# Altium footprint library 2020-09-26_17-27-19.PcbLib: 69 footprints (part 5 of 5)
Each footprint in its own frame and in the unit in brackets; x right, y up, seen from the top. Pads: shape width x height; smd on the part's side, far side on the other; paste and mask are expansions set on the pad; w line width, h text height; cw(c..) or ccw(c..) is an arc to the next point about the centre after c.
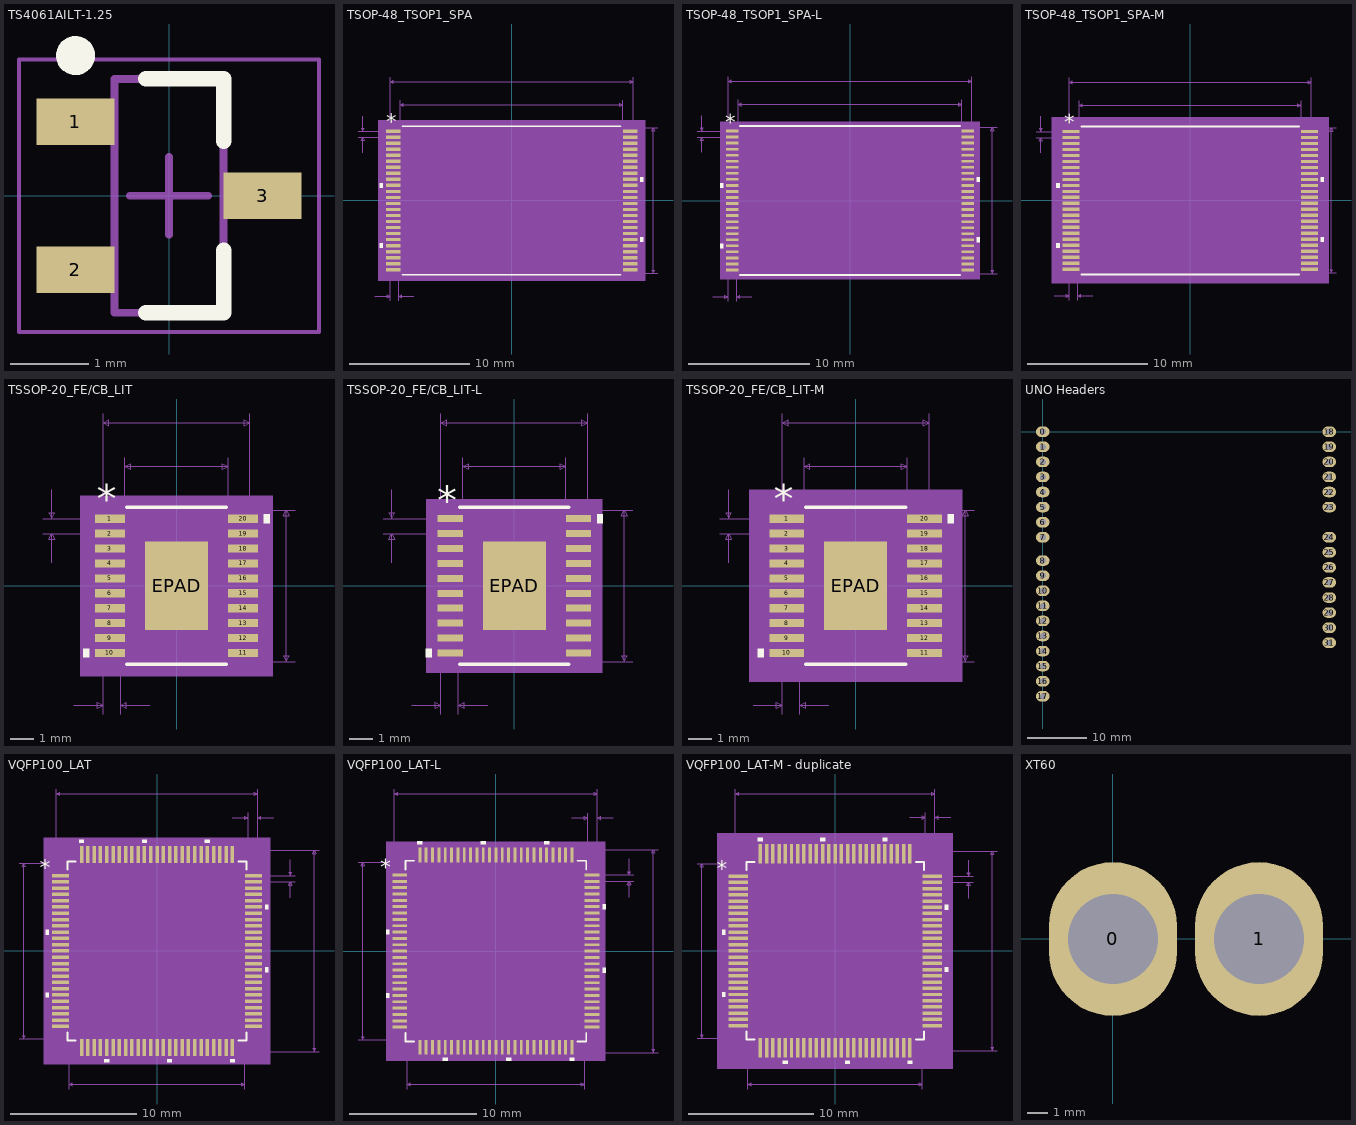
[diagram p4: the footprints below, top view; thin cyan lines are the x and y axes]

## TS4061AILT-1.25 [mm] "SOT23, 3-Leads, Body 2.90x2.45mm, Pitch 0.95mm, IPC Medium Density"
height 1.12
pads (3):
  rect 1x0.6 smd: 1(-1.2,0.95) 2(-1.2,-0.95) 3(1.2,0)
Top Overlay:
  circle w0.25: c-1.2,1.8 r0.125
  lines w0.2: -0.3,-1.5 0.7,-1.5 0.7,-0.7 ; -0.3,1.5 0.7,1.5 0.7,0.7
Mechanical 13:
  lines w0.1: -0.7,-1.5 0.7,-1.5 0.7,1.5 -0.7,1.5 -0.7,-1.5
Mechanical 15:
  lines w0.05: -1.925,-1.75 1.925,-1.75 1.925,1.75 -1.925,1.75 -1.925,-1.75
  lines w0.1: -0.5,0 0.5,0 ; 0,-0.5 0,0.5
3D body "SOT95P245X112-3N.step": height 1.12, standoff 0, extent -1.3,-1.5 1.3,1.5

## TSOP-48_TSOP1_SPA [mil]
pads (48):
  rect 47.5x11 smd paste+0 mask+0: 1(-387.75,226.38) 2(-387.75,206.69) 3(-387.75,187.01) 4(-387.75,167.32) 5(-387.75,147.64) 6(-387.75,127.95) 7(-387.75,108.27) 8(-387.75,88.58) 9(-387.75,68.9) 10(-387.75,49.21) 11(-387.75,29.53) 12(-387.75,9.84) 13(-387.75,-9.84) 14(-387.75,-29.53) 15(-387.75,-49.21) 16(-387.75,-68.9) 17(-387.75,-88.58) 18(-387.75,-108.27) 19(-387.75,-127.95) 20(-387.75,-147.64) 21(-387.75,-167.32) 22(-387.75,-187.01) 23(-387.75,-206.69) 24(-387.75,-226.38) 25(387.75,-226.38) 26(387.75,-206.69) 27(387.75,-187.01) 28(387.75,-167.32) 29(387.75,-147.64) 30(387.75,-127.95) 31(387.75,-108.27) 32(387.75,-88.58) 33(387.75,-68.9) 34(387.75,-49.21) 35(387.75,-29.53) 36(387.75,-9.84) 37(387.75,9.84) 38(387.75,29.53) 39(387.75,49.21) 40(387.75,68.9) 41(387.75,88.58) 42(387.75,108.27) 43(387.75,127.95) 44(387.75,147.64) 45(387.75,167.32) 46(387.75,187.01) 47(387.75,206.69) 48(387.75,226.38)
Top Overlay:
  region: -421.5,56.71 -431.5,56.71 -431.5,41.71 -421.5,41.71
  region: -421.5,-140.14 -431.5,-140.14 -431.5,-155.14 -421.5,-155.14
  region: 421.5,-120.45 431.5,-120.45 431.5,-135.45 421.5,-135.45
  region: 421.5,76.4 431.5,76.4 431.5,61.4 421.5,61.4
  lines w6: -357.08,-243 357.08,-243 ; -357.08,243 357.08,243
  text "*" at -410.25,232.38 h50
Mechanical 5:
  region: 436.5,-263 -436.5,-263 -436.5,263 436.5,263
Mechanical 7:
  lines w1: -502.75,206.69 -387.75,206.69 ; -502.75,226.38 -387.75,226.38 ; -487.75,156.69 -487.75,206.69 ; -487.75,276.38 -487.75,226.38 ; -447.5,-313 -397.5,-313 ; -397.5,-328 -397.5,0 -397.5,403 ; -369.5,-328 -369.5,0 ; -364,0 -364,328 ; -319.5,-313 -369.5,-313 ; 0,-238 479,-238 ; 0,238 479,238 ; 364,0 364,328 ; 397.5,0 397.5,403 ; -487.75,206.69 -492.75,196.69 -482.75,196.69 -487.75,206.69 ; -487.75,226.38 -492.75,236.38 -482.75,236.38 -487.75,226.38 ; -397.5,-313 -407.5,-308 -407.5,-318 -397.5,-313 ; -397.5,388 397.5,388 ; -397.5,388 -387.5,393 -387.5,383 -397.5,388 ; -369.5,-313 -359.5,-308 -359.5,-318 -369.5,-313 ; -364,313 364,313 ; -364,313 -354,318 -354,308 -364,313 ; 364,313 354,318 354,308 364,313 ; 397.5,388 387.5,393 387.5,383 397.5,388 ; 464,-238 464,238 ; 464,-238 459,-228 469,-228 464,-238 ; 464,238 459,228 469,228 464,238
  text "Default Padstyle: RX47p5Y11D0T" at -375,-438 h50
  text "Pin One Padstyle: RX47p5Y11D0T" at -375,-498 h50
  text "Alt 1 Padstyle: OX60Y90D30P" at -337.5,-678 h50
  text "Alt 2 Padstyle: OX90Y60D30P" at -337.5,-738 h50
  text "0.728in/18.491mm" at -100,333 h25
  text "0.795in/20.193mm" at -100,408 h25
  text "0.476in/12.09mm" at 484,-12.5 h25
  text "0.02in/0.5mm" at -657.75,204.04 h25
  text "0.028in/0.711mm" at -477.25,-358 h25
Mechanical 13:
  drawing of 197 lines, arcs and shapes, not listed
  text "*" at -361.5,185 h50
Mechanical 15:
  region: -374,-241.88 -421.5,-241.88 -421.5,241.88 -374,241.88 -374,248 374,248 374,241.88 421.5,241.88 421.5,-241.88 374,-241.88 374,-248 -374,-248
  lines w6: -421.5,-241.88 -421.5,241.88 -374,241.88 -374,248 374,248 374,241.88 421.5,241.88 421.5,-241.88 374,-241.88 374,-248 -374,-248 -374,-241.88 -421.5,-241.88
3D body: height 10, standoff 0, extent 0,0 10,10

## TSOP-48_TSOP1_SPA-L [mil]
pads (48):
  rect 39.5x9 smd paste+0 mask+0: 1(-383.75,226.38) 2(-383.75,206.69) 3(-383.75,187.01) 4(-383.75,167.32) 5(-383.75,147.64) 6(-383.75,127.95) 7(-383.75,108.27) 8(-383.75,88.58) 9(-383.75,68.9) 10(-383.75,49.21) 11(-383.75,29.53) 12(-383.75,9.84) 13(-383.75,-9.84) 14(-383.75,-29.53) 15(-383.75,-49.21) 16(-383.75,-68.9) 17(-383.75,-88.58) 18(-383.75,-108.27) 19(-383.75,-127.95) 20(-383.75,-147.64) 21(-383.75,-167.32) 22(-383.75,-187.01) 23(-383.75,-206.69) 24(-383.75,-226.38) 25(383.75,-226.38) 26(383.75,-206.69) 27(383.75,-187.01) 28(383.75,-167.32) 29(383.75,-147.64) 30(383.75,-127.95) 31(383.75,-108.27) 32(383.75,-88.58) 33(383.75,-68.9) 34(383.75,-49.21) 35(383.75,-29.53) 36(383.75,-9.84) 37(383.75,9.84) 38(383.75,29.53) 39(383.75,49.21) 40(383.75,68.9) 41(383.75,88.58) 42(383.75,108.27) 43(383.75,127.95) 44(383.75,147.64) 45(383.75,167.32) 46(383.75,187.01) 47(383.75,206.69) 48(383.75,226.38)
Top Overlay:
  region: 413.5,76.4 423.5,76.4 423.5,61.4 413.5,61.4
  region: 413.5,-120.45 423.5,-120.45 423.5,-135.45 413.5,-135.45
  region: -413.5,-140.14 -423.5,-140.14 -423.5,-155.14 -413.5,-155.14
  region: -413.5,56.71 -423.5,56.71 -423.5,41.71 -413.5,41.71
  lines w6: -359.03,-243 359.03,-243 ; -359.03,243 359.03,243
  text "*" at -406.25,230.38 h50
Mechanical 5:
  region: 422.5,-257 -422.5,-257 -422.5,257 422.5,257
Mechanical 7:
  lines w1: -498.75,206.69 -383.75,206.69 ; -498.75,226.38 -383.75,226.38 ; -483.75,156.69 -483.75,206.69 ; -483.75,276.38 -483.75,226.38 ; -447.5,-313 -397.5,-313 ; -397.5,-328 -397.5,0 -397.5,403 ; -369.5,-328 -369.5,0 ; -364,0 -364,328 ; -319.5,-313 -369.5,-313 ; 0,-238 479,-238 ; 0,238 479,238 ; 364,0 364,328 ; 397.5,0 397.5,403 ; -483.75,206.69 -478.75,196.69 -488.75,196.69 -483.75,206.69 ; -483.75,226.38 -478.75,236.38 -488.75,236.38 -483.75,226.38 ; -397.5,-313 -407.5,-318 -407.5,-308 -397.5,-313 ; -397.5,388 -387.5,383 -387.5,393 -397.5,388 ; -397.5,388 397.5,388 ; -369.5,-313 -359.5,-318 -359.5,-308 -369.5,-313 ; -364,313 -354,308 -354,318 -364,313 ; -364,313 364,313 ; 364,313 354,308 354,318 364,313 ; 397.5,388 387.5,383 387.5,393 397.5,388 ; 464,-238 469,-228 459,-228 464,-238 ; 464,-238 464,238 ; 464,238 469,228 459,228 464,238
  text "0.028in/0.711mm" at -477.25,-358 h25
  text "0.02in/0.5mm" at -653.75,204.04 h25
  text "0.476in/12.09mm" at 484,-12.5 h25
  text "0.795in/20.193mm" at -100,408 h25
  text "0.728in/18.491mm" at -100,333 h25
  text "Alt 2 Padstyle: OX90Y60D30P" at -337.5,-738 h50
  text "Alt 1 Padstyle: OX60Y90D30P" at -337.5,-678 h50
  text "Pin One Padstyle: RX39p5Y9D0T" at -362.5,-498 h50
  text "Default Padstyle: RX39p5Y9D0T" at -362.5,-438 h50
Mechanical 13:
  drawing of 197 lines, arcs and shapes, not listed
  text "*" at -361.5,185 h50
Mechanical 15:
  region: -368,-234.88 -407.5,-234.88 -407.5,234.88 -368,234.88 -368,242 368,242 368,234.88 407.5,234.88 407.5,-234.88 368,-234.88 368,-242 -368,-242
  lines w6: -407.5,-234.88 -368,-234.88 -368,-242 368,-242 368,-234.88 407.5,-234.88 407.5,234.88 368,234.88 368,242 -368,242 -368,234.88 -407.5,234.88 -407.5,-234.88
3D body: height 10, standoff 0, extent 0,0 10,10

## TSOP-48_TSOP1_SPA-M [mil]
pads (48):
  rect 55.5x11 smd paste+0 mask+0: 1(-391.75,226.38) 2(-391.75,206.69) 3(-391.75,187.01) 4(-391.75,167.32) 5(-391.75,147.64) 6(-391.75,127.95) 7(-391.75,108.27) 8(-391.75,88.58) 9(-391.75,68.9) 10(-391.75,49.21) 11(-391.75,29.53) 12(-391.75,9.84) 13(-391.75,-9.84) 14(-391.75,-29.53) 15(-391.75,-49.21) 16(-391.75,-68.9) 17(-391.75,-88.58) 18(-391.75,-108.27) 19(-391.75,-127.95) 20(-391.75,-147.64) 21(-391.75,-167.32) 22(-391.75,-187.01) 23(-391.75,-206.69) 24(-391.75,-226.38) 25(391.75,-226.38) 26(391.75,-206.69) 27(391.75,-187.01) 28(391.75,-167.32) 29(391.75,-147.64) 30(391.75,-127.95) 31(391.75,-108.27) 32(391.75,-88.58) 33(391.75,-68.9) 34(391.75,-49.21) 35(391.75,-29.53) 36(391.75,-9.84) 37(391.75,9.84) 38(391.75,29.53) 39(391.75,49.21) 40(391.75,68.9) 41(391.75,88.58) 42(391.75,108.27) 43(391.75,127.95) 44(391.75,147.64) 45(391.75,167.32) 46(391.75,187.01) 47(391.75,206.69) 48(391.75,226.38)
Top Overlay:
  region: 429.5,76.4 439.5,76.4 439.5,61.4 429.5,61.4
  region: 429.5,-120.45 439.5,-120.45 439.5,-135.45 429.5,-135.45
  region: -429.5,-140.14 -439.5,-140.14 -439.5,-155.14 -429.5,-155.14
  region: -429.5,56.71 -439.5,56.71 -439.5,41.71 -429.5,41.71
  lines w6: -357.08,-243 357.08,-243 ; -357.08,243 357.08,243
  text "*" at -414.25,232.38 h50
Mechanical 5:
  region: 454.5,-273 -454.5,-273 -454.5,273 454.5,273
Mechanical 7:
  lines w1: -506.75,206.69 -391.75,206.69 ; -506.75,226.38 -391.75,226.38 ; -491.75,156.69 -491.75,206.69 ; -491.75,276.38 -491.75,226.38 ; -447.5,-313 -397.5,-313 ; -397.5,-328 -397.5,0 -397.5,403 ; -369.5,-328 -369.5,0 ; -364,0 -364,328 ; -319.5,-313 -369.5,-313 ; 0,-238 479,-238 ; 0,238 479,238 ; 364,0 364,328 ; 397.5,0 397.5,403 ; -491.75,206.69 -486.75,196.69 -496.75,196.69 -491.75,206.69 ; -491.75,226.38 -486.75,236.38 -496.75,236.38 -491.75,226.38 ; -397.5,-313 -407.5,-318 -407.5,-308 -397.5,-313 ; -397.5,388 -387.5,383 -387.5,393 -397.5,388 ; -397.5,388 397.5,388 ; -369.5,-313 -359.5,-318 -359.5,-308 -369.5,-313 ; -364,313 -354,308 -354,318 -364,313 ; -364,313 364,313 ; 364,313 354,308 354,318 364,313 ; 397.5,388 387.5,383 387.5,393 397.5,388 ; 464,-238 469,-228 459,-228 464,-238 ; 464,-238 464,238 ; 464,238 469,228 459,228 464,238
  text "0.028in/0.711mm" at -477.25,-358 h25
  text "0.02in/0.5mm" at -661.75,204.04 h25
  text "0.476in/12.09mm" at 484,-12.5 h25
  text "0.795in/20.193mm" at -100,408 h25
  text "0.728in/18.491mm" at -100,333 h25
  text "Alt 2 Padstyle: OX90Y60D30P" at -337.5,-738 h50
  text "Alt 1 Padstyle: OX60Y90D30P" at -337.5,-678 h50
  text "Pin One Padstyle: RX55p5Y11D0T" at -375,-498 h50
  text "Default Padstyle: RX55p5Y11D0T" at -375,-438 h50
Mechanical 13:
  drawing of 197 lines, arcs and shapes, not listed
  text "*" at -361.5,185 h50
Mechanical 15:
  region: -384,-251.88 -439.5,-251.88 -439.5,251.88 -384,251.88 -384,258 384,258 384,251.88 439.5,251.88 439.5,-251.88 384,-251.88 384,-258 -384,-258
  lines w6: -439.5,-251.88 -384,-251.88 -384,-258 384,-258 384,-251.88 439.5,-251.88 439.5,251.88 384,251.88 384,258 -384,258 -384,251.88 -439.5,251.88 -439.5,-251.88
3D body: height 10, standoff 0, extent 0,0 10,10
3D body "TSOP-48_TSOP1_SPA.step": height 47.09, standoff 0, extent -397.52,-237.99 397.52,237.99

## TSSOP-20_FE/CB_LIT [mil]
pads (21):
  rect 51.5x14 smd paste+0 mask+0: 1(-114.25,115.2) 2(-114.25,89.6) 3(-114.25,64) 4(-114.25,38.4) 5(-114.25,12.8) 6(-114.25,-12.8) 7(-114.25,-38.4) 8(-114.25,-64) 9(-114.25,-89.6) 10(-114.25,-115.2) 11(114.25,-115.2) 12(114.25,-89.6) 13(114.25,-64) 14(114.25,-38.4) 15(114.25,-12.8) 16(114.25,12.8) 17(114.25,38.4) 18(114.25,64) 19(114.25,89.6) 20(114.25,115.2)
  rect 108x152 smd paste-75.5 mask+0: EPAD(0,0)
Top Overlay:
  region: -150,-107.7 -160,-107.7 -160,-122.7 -150,-122.7
  region: 150,122.7 160,122.7 160,107.7 150,107.7
  lines w6: -85.71,-135 85.71,-135 ; -85.71,135 85.71,135
  text "*" at -136.75,124.2 h50
Top Paste:
  region: -3.94,72.06 -50.06,72.06 -50.06,29.27 -3.94,29.27
  region: -3.94,21.4 -50.06,21.4 -50.06,-21.4 -3.94,-21.4
  region: -3.94,-29.27 -50.06,-29.27 -50.06,-72.06 -3.94,-72.06
  region: 50.06,72.06 3.94,72.06 3.94,29.27 50.06,29.27
  region: 50.06,21.4 3.94,21.4 3.94,-21.4 50.06,-21.4
  region: 50.06,-29.27 3.94,-29.27 3.94,-72.06 50.06,-72.06
Mechanical 5:
  region: 165,-155 -165,-155 -165,155 165,155
Mechanical 7:
  lines w1: -229.25,89.6 -114.25,89.6 ; -229.25,115.2 -114.25,115.2 ; -214.25,39.6 -214.25,89.6 ; -214.25,165.2 -214.25,115.2 ; -176,-205 -126,-205 ; -126,-220 -126,0 -126,295 ; -96,-220 -96,0 ; -88.5,0 -88.5,220 ; -46,-205 -96,-205 ; 0,-130 203.5,-130 ; 0,130 203.5,130 ; 88.5,0 88.5,220 ; 126,0 126,295 ; -214.25,89.6 -219.25,79.6 -209.25,79.6 -214.25,89.6 ; -214.25,115.2 -219.25,125.2 -209.25,125.2 -214.25,115.2 ; -126,-205 -136,-200 -136,-210 -126,-205 ; -126,280 126,280 ; -126,280 -116,285 -116,275 -126,280 ; -96,-205 -86,-200 -86,-210 -96,-205 ; -88.5,205 88.5,205 ; -88.5,205 -78.5,210 -78.5,200 -88.5,205 ; 88.5,205 78.5,210 78.5,200 88.5,205 ; 126,280 116,285 116,275 126,280 ; 188.5,-130 188.5,130 ; 188.5,-130 183.5,-120 193.5,-120 188.5,-130 ; 188.5,130 183.5,120 193.5,120 188.5,130
  text "Default Padstyle: RX51p5Y14D0T" at -375,-330 h50
  text "Pin One Padstyle: RX51p5Y14D0T" at -375,-390 h50
  text "Heat Tab Padstyle: RX108Y152D0T" at -387.5,-450 h50
  text "Alt 1 Padstyle: OX60Y90D30P" at -337.5,-570 h50
  text "Alt 2 Padstyle: OX90Y60D30P" at -337.5,-630 h50
  text "0.177in/4.496mm" at -93.75,225 h25
  text "0.252in/6.401mm" at -93.75,300 h25
  text "0.26in/6.604mm" at 208.5,-12.5 h25
  text "0.026in/0.65mm" at -409.25,89.9 h25
  text "0.03in/0.762mm" at -198.5,-250 h25
Mechanical 13:
  lines w0: -12,130 ccw(c0,130) 12,130
  lines w1: -126,-121.2 -126,-109.2 -88.5,-109.2 -88.5,-121.2 -126,-121.2 ; -126,-95.6 -126,-83.6 -88.5,-83.6 -88.5,-95.6 -126,-95.6 ; -126,-70 -126,-58 -88.5,-58 -88.5,-70 -126,-70 ; -126,-44.4 -126,-32.4 -88.5,-32.4 -88.5,-44.4 -126,-44.4 ; -126,-18.8 -126,-6.8 -88.5,-6.8 -88.5,-18.8 -126,-18.8 ; -126,6.8 -126,18.8 -88.5,18.8 -88.5,6.8 -126,6.8 ; -126,32.4 -126,44.4 -88.5,44.4 -88.5,32.4 -126,32.4 ; -126,58 -126,70 -88.5,70 -88.5,58 -126,58 ; -126,83.6 -126,95.6 -88.5,95.6 -88.5,83.6 -126,83.6 ; -126,109.2 -126,121.2 -88.5,121.2 -88.5,109.2 -126,109.2 ; -88.5,-130 88.5,-130 88.5,130 -88.5,130 -88.5,-130 ; 88.5,-121.2 88.5,-109.2 126,-109.2 126,-121.2 88.5,-121.2 ; 88.5,-95.6 88.5,-83.6 126,-83.6 126,-95.6 88.5,-95.6 ; 88.5,-70 88.5,-58 126,-58 126,-70 88.5,-70 ; 88.5,-44.4 88.5,-32.4 126,-32.4 126,-44.4 88.5,-44.4 ; 88.5,-18.8 88.5,-6.8 126,-6.8 126,-18.8 88.5,-18.8 ; 88.5,6.8 88.5,18.8 126,18.8 126,6.8 88.5,6.8 ; 88.5,32.4 88.5,44.4 126,44.4 126,32.4 88.5,32.4 ; 88.5,58 88.5,70 126,70 126,58 88.5,58 ; 88.5,83.6 88.5,95.6 126,95.6 126,83.6 88.5,83.6 ; 88.5,109.2 88.5,121.2 126,121.2 126,109.2 88.5,109.2
  text "*" at -86,77 h50
Mechanical 15:
  region: -98.5,-132.2 -150,-132.2 -150,132.2 -98.5,132.2 -98.5,140 98.5,140 98.5,132.2 150,132.2 150,-132.2 98.5,-132.2 98.5,-140 -98.5,-140
  lines w6: -150,-132.2 -150,132.2 -98.5,132.2 -98.5,140 98.5,140 98.5,132.2 150,132.2 150,-132.2 98.5,-132.2 98.5,-140 -98.5,-140 -98.5,-132.2 -150,-132.2
3D body: height 10, standoff 0, extent 0,0 10,10

## TSSOP-20_FE/CB_LIT-L [mil]
pads (21):
  rect 43.5x12 smd paste+0 mask+0: 1(-110.25,115.2) 2(-110.25,89.6) 3(-110.25,64) 4(-110.25,38.4) 5(-110.25,12.8) 6(-110.25,-12.8) 7(-110.25,-38.4) 8(-110.25,-64) 9(-110.25,-89.6) 10(-110.25,-115.2) 11(110.25,-115.2) 12(110.25,-89.6) 13(110.25,-64) 14(110.25,-38.4) 15(110.25,-12.8) 16(110.25,12.8) 17(110.25,38.4) 18(110.25,64) 19(110.25,89.6) 20(110.25,115.2)
  rect 108x152 smd paste-75.5 mask+0: EPAD(0,0)
Top Overlay:
  region: -142,-107.7 -152,-107.7 -152,-122.7 -142,-122.7
  region: 142,122.7 152,122.7 152,107.7 142,107.7
  lines w6: -93.5,-135 93.5,-135 ; -93.5,135 93.5,135
  text "*" at -132.75,122.2 h50
Top Paste:
  region: -3.94,72.06 -50.06,72.06 -50.06,29.27 -3.94,29.27
  region: -3.94,21.4 -50.06,21.4 -50.06,-21.4 -3.94,-21.4
  region: -3.94,-29.27 -50.06,-29.27 -50.06,-72.06 -3.94,-72.06
  region: 50.06,72.06 3.94,72.06 3.94,29.27 50.06,29.27
  region: 50.06,21.4 3.94,21.4 3.94,-21.4 50.06,-21.4
  region: 50.06,-29.27 3.94,-29.27 3.94,-72.06 50.06,-72.06
Mechanical 5:
  region: 151,-149 -151,-149 -151,149 151,149
Mechanical 7:
  lines w1: -225.25,89.6 -110.25,89.6 ; -225.25,115.2 -110.25,115.2 ; -210.25,39.6 -210.25,89.6 ; -210.25,165.2 -210.25,115.2 ; -176,-205 -126,-205 ; -126,-220 -126,0 -126,295 ; -96,-220 -96,0 ; -88.5,0 -88.5,220 ; -46,-205 -96,-205 ; 0,-130 203.5,-130 ; 0,130 203.5,130 ; 88.5,0 88.5,220 ; 126,0 126,295 ; -210.25,89.6 -215.25,79.6 -205.25,79.6 -210.25,89.6 ; -210.25,115.2 -215.25,125.2 -205.25,125.2 -210.25,115.2 ; -126,-205 -136,-200 -136,-210 -126,-205 ; -126,280 126,280 ; -126,280 -116,285 -116,275 -126,280 ; -96,-205 -86,-200 -86,-210 -96,-205 ; -88.5,205 88.5,205 ; -88.5,205 -78.5,210 -78.5,200 -88.5,205 ; 88.5,205 78.5,210 78.5,200 88.5,205 ; 126,280 116,285 116,275 126,280 ; 188.5,-130 188.5,130 ; 188.5,-130 183.5,-120 193.5,-120 188.5,-130 ; 188.5,130 183.5,120 193.5,120 188.5,130
  text "Default Padstyle: RX43p5Y12D0T" at -375,-330 h50
  text "Pin One Padstyle: RX43p5Y12D0T" at -375,-390 h50
  text "Heat Tab Padstyle: RX108Y152D0T" at -387.5,-450 h50
  text "Alt 1 Padstyle: OX60Y90D30P" at -337.5,-570 h50
  text "Alt 2 Padstyle: OX90Y60D30P" at -337.5,-630 h50
  text "0.177in/4.496mm" at -93.75,225 h25
  text "0.252in/6.401mm" at -93.75,300 h25
  text "0.26in/6.604mm" at 208.5,-12.5 h25
  text "0.026in/0.65mm" at -405.25,89.9 h25
  text "0.03in/0.762mm" at -198.5,-250 h25
Mechanical 13:
  lines w0: -12,130 ccw(c0,130) 12,130
  lines w1: -126,-121.2 -126,-109.2 -88.5,-109.2 -88.5,-121.2 -126,-121.2 ; -126,-95.6 -126,-83.6 -88.5,-83.6 -88.5,-95.6 -126,-95.6 ; -126,-70 -126,-58 -88.5,-58 -88.5,-70 -126,-70 ; -126,-44.4 -126,-32.4 -88.5,-32.4 -88.5,-44.4 -126,-44.4 ; -126,-18.8 -126,-6.8 -88.5,-6.8 -88.5,-18.8 -126,-18.8 ; -126,6.8 -126,18.8 -88.5,18.8 -88.5,6.8 -126,6.8 ; -126,32.4 -126,44.4 -88.5,44.4 -88.5,32.4 -126,32.4 ; -126,58 -126,70 -88.5,70 -88.5,58 -126,58 ; -126,83.6 -126,95.6 -88.5,95.6 -88.5,83.6 -126,83.6 ; -126,109.2 -126,121.2 -88.5,121.2 -88.5,109.2 -126,109.2 ; -88.5,-130 88.5,-130 88.5,130 -88.5,130 -88.5,-130 ; 88.5,-121.2 88.5,-109.2 126,-109.2 126,-121.2 88.5,-121.2 ; 88.5,-95.6 88.5,-83.6 126,-83.6 126,-95.6 88.5,-95.6 ; 88.5,-70 88.5,-58 126,-58 126,-70 88.5,-70 ; 88.5,-44.4 88.5,-32.4 126,-32.4 126,-44.4 88.5,-44.4 ; 88.5,-18.8 88.5,-6.8 126,-6.8 126,-18.8 88.5,-18.8 ; 88.5,6.8 88.5,18.8 126,18.8 126,6.8 88.5,6.8 ; 88.5,32.4 88.5,44.4 126,44.4 126,32.4 88.5,32.4 ; 88.5,58 88.5,70 126,70 126,58 88.5,58 ; 88.5,83.6 88.5,95.6 126,95.6 126,83.6 88.5,83.6 ; 88.5,109.2 88.5,121.2 126,121.2 126,109.2 88.5,109.2
  text "*" at -86,77 h50
Mechanical 15:
  region: -92.5,-125.2 -136,-125.2 -136,125.2 -92.5,125.2 -92.5,134 92.5,134 92.5,125.2 136,125.2 136,-125.2 92.5,-125.2 92.5,-134 -92.5,-134
  lines w6: -136,-125.2 -136,125.2 -92.5,125.2 -92.5,134 92.5,134 92.5,125.2 136,125.2 136,-125.2 92.5,-125.2 92.5,-134 -92.5,-134 -92.5,-125.2 -136,-125.2
3D body: height 10, standoff 0, extent 0,0 10,10

## TSSOP-20_FE/CB_LIT-M [mil]
pads (21):
  rect 59.5x14 smd paste+0 mask+0: 1(-118.25,115.2) 2(-118.25,89.6) 3(-118.25,64) 4(-118.25,38.4) 5(-118.25,12.8) 6(-118.25,-12.8) 7(-118.25,-38.4) 8(-118.25,-64) 9(-118.25,-89.6) 10(-118.25,-115.2) 11(118.25,-115.2) 12(118.25,-89.6) 13(118.25,-64) 14(118.25,-38.4) 15(118.25,-12.8) 16(118.25,12.8) 17(118.25,38.4) 18(118.25,64) 19(118.25,89.6) 20(118.25,115.2)
  rect 108x152 smd paste-75.5 mask+0: EPAD(0,0)
Top Overlay:
  region: -158,-107.7 -168,-107.7 -168,-122.7 -158,-122.7
  region: 158,122.7 168,122.7 168,107.7 158,107.7
  lines w6: -85.71,-135 85.71,-135 ; -85.71,135 85.71,135
  text "*" at -140.75,124.2 h50
Top Paste:
  region: -3.94,72.06 -50.06,72.06 -50.06,29.27 -3.94,29.27
  region: -3.94,21.4 -50.06,21.4 -50.06,-21.4 -3.94,-21.4
  region: -3.94,-29.27 -50.06,-29.27 -50.06,-72.06 -3.94,-72.06
  region: 50.06,72.06 3.94,72.06 3.94,29.27 50.06,29.27
  region: 50.06,21.4 3.94,21.4 3.94,-21.4 50.06,-21.4
  region: 50.06,-29.27 3.94,-29.27 3.94,-72.06 50.06,-72.06
Mechanical 5:
  region: 183,-165 -183,-165 -183,165 183,165
Mechanical 7:
  lines w1: -233.25,89.6 -118.25,89.6 ; -233.25,115.2 -118.25,115.2 ; -218.25,39.6 -218.25,89.6 ; -218.25,165.2 -218.25,115.2 ; -176,-205 -126,-205 ; -126,-220 -126,0 -126,295 ; -96,-220 -96,0 ; -88.5,0 -88.5,220 ; -46,-205 -96,-205 ; 0,-130 203.5,-130 ; 0,130 203.5,130 ; 88.5,0 88.5,220 ; 126,0 126,295 ; -218.25,89.6 -223.25,79.6 -213.25,79.6 -218.25,89.6 ; -218.25,115.2 -223.25,125.2 -213.25,125.2 -218.25,115.2 ; -126,-205 -136,-200 -136,-210 -126,-205 ; -126,280 126,280 ; -126,280 -116,285 -116,275 -126,280 ; -96,-205 -86,-200 -86,-210 -96,-205 ; -88.5,205 88.5,205 ; -88.5,205 -78.5,210 -78.5,200 -88.5,205 ; 88.5,205 78.5,210 78.5,200 88.5,205 ; 126,280 116,285 116,275 126,280 ; 188.5,-130 188.5,130 ; 188.5,-130 183.5,-120 193.5,-120 188.5,-130 ; 188.5,130 183.5,120 193.5,120 188.5,130
  text "Default Padstyle: RX59p5Y14D0T" at -375,-330 h50
  text "Pin One Padstyle: RX59p5Y14D0T" at -375,-390 h50
  text "Heat Tab Padstyle: RX108Y152D0T" at -387.5,-450 h50
  text "Alt 1 Padstyle: OX60Y90D30P" at -337.5,-570 h50
  text "Alt 2 Padstyle: OX90Y60D30P" at -337.5,-630 h50
  text "0.177in/4.496mm" at -93.75,225 h25
  text "0.252in/6.401mm" at -93.75,300 h25
  text "0.26in/6.604mm" at 208.5,-12.5 h25
  text "0.026in/0.65mm" at -413.25,89.9 h25
  text "0.03in/0.762mm" at -198.5,-250 h25
Mechanical 13:
  lines w0: -12,130 ccw(c0,130) 12,130
  lines w1: -126,-121.2 -126,-109.2 -88.5,-109.2 -88.5,-121.2 -126,-121.2 ; -126,-95.6 -126,-83.6 -88.5,-83.6 -88.5,-95.6 -126,-95.6 ; -126,-70 -126,-58 -88.5,-58 -88.5,-70 -126,-70 ; -126,-44.4 -126,-32.4 -88.5,-32.4 -88.5,-44.4 -126,-44.4 ; -126,-18.8 -126,-6.8 -88.5,-6.8 -88.5,-18.8 -126,-18.8 ; -126,6.8 -126,18.8 -88.5,18.8 -88.5,6.8 -126,6.8 ; -126,32.4 -126,44.4 -88.5,44.4 -88.5,32.4 -126,32.4 ; -126,58 -126,70 -88.5,70 -88.5,58 -126,58 ; -126,83.6 -126,95.6 -88.5,95.6 -88.5,83.6 -126,83.6 ; -126,109.2 -126,121.2 -88.5,121.2 -88.5,109.2 -126,109.2 ; -88.5,-130 88.5,-130 88.5,130 -88.5,130 -88.5,-130 ; 88.5,-121.2 88.5,-109.2 126,-109.2 126,-121.2 88.5,-121.2 ; 88.5,-95.6 88.5,-83.6 126,-83.6 126,-95.6 88.5,-95.6 ; 88.5,-70 88.5,-58 126,-58 126,-70 88.5,-70 ; 88.5,-44.4 88.5,-32.4 126,-32.4 126,-44.4 88.5,-44.4 ; 88.5,-18.8 88.5,-6.8 126,-6.8 126,-18.8 88.5,-18.8 ; 88.5,6.8 88.5,18.8 126,18.8 126,6.8 88.5,6.8 ; 88.5,32.4 88.5,44.4 126,44.4 126,32.4 88.5,32.4 ; 88.5,58 88.5,70 126,70 126,58 88.5,58 ; 88.5,83.6 88.5,95.6 126,95.6 126,83.6 88.5,83.6 ; 88.5,109.2 88.5,121.2 126,121.2 126,109.2 88.5,109.2
  text "*" at -86,77 h50
Mechanical 15:
  region: -108.5,-142.2 -168,-142.2 -168,142.2 -108.5,142.2 -108.5,150 108.5,150 108.5,142.2 168,142.2 168,-142.2 108.5,-142.2 108.5,-150 -108.5,-150
  lines w6: -168,-142.2 -168,142.2 -108.5,142.2 -108.5,150 108.5,150 108.5,142.2 168,142.2 168,-142.2 108.5,-142.2 108.5,-150 -108.5,-150 -108.5,-142.2 -168,-142.2
3D body: height 10, standoff 0, extent 0,0 10,10

## UNO Headers [mil]
pads (32):
  oval 90x70 hole 40: 0(0,0) 1(0,-100) 2(0,-200) 3(0,-300) 4(0,-400) 5(0,-500) 6(0,-600) 7(0,-700) 8(0,-855) 9(0,-955) 10(0,-1055) 11(0,-1155) 12(0,-1255) 13(0,-1355) 14(0,-1455) 15(0,-1555) 16(0,-1655) 17(0,-1755) 18(1900,0) 19(1900,-100) 20(1900,-200) 21(1900,-300) 22(1900,-400) 23(1900,-500) 24(1900,-700) 25(1900,-800) 26(1900,-900) 27(1900,-1000) 28(1900,-1100) 29(1900,-1200) 30(1900,-1300) 31(1900,-1400)

## VQFP100_LAT [mil]
pads (100):
  rect 53.5x11 smd paste+0 mask+0: 1(-302.25,236.22) 2(-302.25,216.54) 3(-302.25,196.85) 4(-302.25,177.17) 5(-302.25,157.48) 6(-302.25,137.8) 7(-302.25,118.11) 8(-302.25,98.43) 9(-302.25,78.74) 10(-302.25,59.06) 11(-302.25,39.37) 12(-302.25,19.69) 13(-302.25,0) 14(-302.25,-19.68) 15(-302.25,-39.37) 16(-302.25,-59.06) 17(-302.25,-78.74) 18(-302.25,-98.43) 19(-302.25,-118.11) 20(-302.25,-137.8) 21(-302.25,-157.48) 22(-302.25,-177.17) 23(-302.25,-196.85) 24(-302.25,-216.54) 25(-302.25,-236.22) 51(302.25,-236.22) 52(302.25,-216.54) 53(302.25,-196.85) 54(302.25,-177.17) 55(302.25,-157.48) 56(302.25,-137.8) 57(302.25,-118.11) 58(302.25,-98.43) 59(302.25,-78.74) 60(302.25,-59.06) 61(302.25,-39.37) 62(302.25,-19.68) 63(302.25,0) 64(302.25,19.68) 65(302.25,39.37) 66(302.25,59.06) 67(302.25,78.74) 68(302.25,98.43) 69(302.25,118.11) 70(302.25,137.8) 71(302.25,157.48) 72(302.25,177.17) 73(302.25,196.85) 74(302.25,216.54) 75(302.25,236.22)
  rect 11x53.5 smd paste+0 mask+0: 26(-236.22,-302.25) 27(-216.54,-302.25) 28(-196.85,-302.25) 29(-177.17,-302.25) 30(-157.48,-302.25) 31(-137.8,-302.25) 32(-118.11,-302.25) 33(-98.43,-302.25) 34(-78.74,-302.25) 35(-59.06,-302.25) 36(-39.37,-302.25) 37(-19.68,-302.25) 38(0,-302.25) 39(19.68,-302.25) 40(39.37,-302.25) 41(59.06,-302.25) 42(78.74,-302.25) 43(98.43,-302.25) 44(118.11,-302.25) 45(137.8,-302.25) 46(157.48,-302.25) 47(177.17,-302.25) 48(196.85,-302.25) 49(216.54,-302.25) 50(236.22,-302.25) 76(236.22,302.25) 77(216.54,302.25) 78(196.85,302.25) 79(177.17,302.25) 80(157.48,302.25) 81(137.8,302.25) 82(118.11,302.25) 83(98.43,302.25) 84(78.74,302.25) 85(59.06,302.25) 86(39.37,302.25) 87(19.68,302.25) 88(0,302.25) 89(-19.68,302.25) 90(-39.37,302.25) 91(-59.06,302.25) 92(-78.74,302.25) 93(-98.43,302.25) 94(-118.11,302.25) 95(-137.8,302.25) 96(-157.48,302.25) 97(-177.17,302.25) 98(-196.85,302.25) 99(-216.54,302.25) 100(-236.22,302.25)
Top Overlay:
  region: -339,66.56 -349,66.56 -349,51.56 -339,51.56
  region: -339,-130.3 -349,-130.3 -349,-145.3 -339,-145.3
  region: -149.98,-339 -164.98,-339 -164.98,-349 -149.98,-349
  region: 46.87,-339 31.87,-339 31.87,-349 46.87,-349
  region: 243.72,-339 228.72,-339 228.72,-349 243.72,-349
  region: 339,-51.56 349,-51.56 349,-66.56 339,-66.56
  region: 339,145.3 349,145.3 349,130.3 339,130.3
  region: 164.98,339 149.98,339 149.98,349 164.98,349
  region: -31.87,339 -46.87,339 -46.87,349 -31.87,349
  region: -228.72,339 -243.72,339 -243.72,349 -228.72,349
  lines w6: -280.5,-254.82 -280.5,-280.5 -254.82,-280.5 ; -280.5,254.82 -280.5,280.5 -254.82,280.5 ; 254.82,-280.5 280.5,-280.5 280.5,-254.82 ; 254.82,280.5 280.5,280.5 280.5,254.82
  text "*" at -366.5,236.06 h50
Mechanical 5:
  region: 354,-354 -354,-354 -354,354 354,354
Mechanical 7:
  lines w1: -432.25,-275.5 -236.22,-275.5 ; -432.25,275.5 -236.22,275.5 ; -315,236.22 -315,507.25 ; -275.5,-432.25 -275.5,-236.22 ; 235,417.25 285,417.25 ; 236.22,-315 507.25,-315 ; 236.22,315 507.25,315 ; 275.5,-432.25 275.5,-236.22 ; 285,236.22 285,432.25 ; 302.25,216.54 432.25,216.54 ; 302.25,236.22 432.25,236.22 ; 315,432.25 315,236.22 315,507.25 ; 365,417.25 315,417.25 ; 417.25,166.54 417.25,216.54 ; 417.25,286.22 417.25,236.22 ; -417.25,-275.5 -417.25,275.5 ; -417.25,-275.5 -422.25,-265.5 -412.25,-265.5 -417.25,-275.5 ; -417.25,275.5 -422.25,265.5 -412.25,265.5 -417.25,275.5 ; -315,492.25 315,492.25 ; -315,492.25 -305,497.25 -305,487.25 -315,492.25 ; -275.5,-417.25 275.5,-417.25 ; -275.5,-417.25 -265.5,-412.25 -265.5,-422.25 -275.5,-417.25 ; 275.5,-417.25 265.5,-412.25 265.5,-422.25 275.5,-417.25 ; 285,417.25 275,422.25 275,412.25 285,417.25 ; 315,417.25 325,422.25 325,412.25 315,417.25 ; 315,492.25 305,497.25 305,487.25 315,492.25 ; 417.25,216.54 412.25,206.54 422.25,206.54 417.25,216.54 ; 417.25,236.22 412.25,246.22 422.25,246.22 417.25,236.22 ; 492.25,-315 492.25,315 ; 492.25,-315 487.25,-305 497.25,-305 492.25,-315 ; 492.25,315 487.25,305 497.25,305 492.25,315
  text "Default Horiz Padstyle: RX11Y53p5D0T" at -450,-567.25 h50
  text "Default Vert Padstyle: RX11Y53p5D0T" at -437.5,-627.25 h50
  text "Alt 1 Padstyle: OX60Y90D30P" at -337.5,-807.25 h50
  text "Alt 2 Padstyle: OX90Y60D30P" at -337.5,-867.25 h50
  text "0.02in/0.5mm" at 437.25,213.88 h25
  text "0.03in/0.762mm" at 212.5,437.25 h25
  text "0.63in/16.002mm" at -93.75,512.25 h25
  text "0.551in/13.995mm" at -100,-462.25 h25
  text "0.551in/13.995mm" at -637.25,-12.5 h25
  text "0.63in/16.002mm" at 512.25,-12.5 h25
Mechanical 13:
  drawing of 405 lines, arcs and shapes, not listed
  text "*" at -273,221.06 h50
Mechanical 15:
  region: -251.72,-285.5 -285.5,-285.5 -285.5,-251.72 -339,-251.72 -339,251.72 -285.5,251.72 -285.5,285.5 -251.72,285.5 -251.72,339 251.72,339 251.72,285.5 285.5,285.5 285.5,251.72 339,251.72 339,-251.72 285.5,-251.72 285.5,-285.5 251.72,-285.5 251.72,-339 -251.72,-339
  lines w6: -339,-251.72 -285.5,-251.72 -285.5,-285.5 -251.72,-285.5 -251.72,-339 251.72,-339 251.72,-285.5 285.5,-285.5 285.5,-251.72 339,-251.72 339,251.72 285.5,251.72 285.5,285.5 251.72,285.5 251.72,339 -251.72,339 -251.72,285.5 -285.5,285.5 -285.5,251.72 -339,251.72 -339,-251.72
3D body: height 10, standoff 0, extent 0,0 10,10

## VQFP100_LAT-L [mil]
pads (100):
  rect 45.5x9 smd paste+0 mask+0: 1(-298.25,236.22) 2(-298.25,216.54) 3(-298.25,196.85) 4(-298.25,177.17) 5(-298.25,157.48) 6(-298.25,137.8) 7(-298.25,118.11) 8(-298.25,98.43) 9(-298.25,78.74) 10(-298.25,59.06) 11(-298.25,39.37) 12(-298.25,19.69) 13(-298.25,0) 14(-298.25,-19.68) 15(-298.25,-39.37) 16(-298.25,-59.06) 17(-298.25,-78.74) 18(-298.25,-98.43) 19(-298.25,-118.11) 20(-298.25,-137.8) 21(-298.25,-157.48) 22(-298.25,-177.17) 23(-298.25,-196.85) 24(-298.25,-216.54) 25(-298.25,-236.22) 51(298.25,-236.22) 52(298.25,-216.54) 53(298.25,-196.85) 54(298.25,-177.17) 55(298.25,-157.48) 56(298.25,-137.8) 57(298.25,-118.11) 58(298.25,-98.43) 59(298.25,-78.74) 60(298.25,-59.06) 61(298.25,-39.37) 62(298.25,-19.68) 63(298.25,0) 64(298.25,19.68) 65(298.25,39.37) 66(298.25,59.06) 67(298.25,78.74) 68(298.25,98.43) 69(298.25,118.11) 70(298.25,137.8) 71(298.25,157.48) 72(298.25,177.17) 73(298.25,196.85) 74(298.25,216.54) 75(298.25,236.22)
  rect 9x45.5 smd paste+0 mask+0: 26(-236.22,-298.25) 27(-216.54,-298.25) 28(-196.85,-298.25) 29(-177.17,-298.25) 30(-157.48,-298.25) 31(-137.8,-298.25) 32(-118.11,-298.25) 33(-98.43,-298.25) 34(-78.74,-298.25) 35(-59.06,-298.25) 36(-39.37,-298.25) 37(-19.68,-298.25) 38(0,-298.25) 39(19.68,-298.25) 40(39.37,-298.25) 41(59.06,-298.25) 42(78.74,-298.25) 43(98.43,-298.25) 44(118.11,-298.25) 45(137.8,-298.25) 46(157.48,-298.25) 47(177.17,-298.25) 48(196.85,-298.25) 49(216.54,-298.25) 50(236.22,-298.25) 76(236.22,298.25) 77(216.54,298.25) 78(196.85,298.25) 79(177.17,298.25) 80(157.48,298.25) 81(137.8,298.25) 82(118.11,298.25) 83(98.43,298.25) 84(78.74,298.25) 85(59.06,298.25) 86(39.37,298.25) 87(19.68,298.25) 88(0,298.25) 89(-19.68,298.25) 90(-39.37,298.25) 91(-59.06,298.25) 92(-78.74,298.25) 93(-98.43,298.25) 94(-118.11,298.25) 95(-137.8,298.25) 96(-157.48,298.25) 97(-177.17,298.25) 98(-196.85,298.25) 99(-216.54,298.25) 100(-236.22,298.25)
Top Overlay:
  region: -228.72,331 -243.72,331 -243.72,341 -228.72,341
  region: -31.87,331 -46.87,331 -46.87,341 -31.87,341
  region: 164.98,331 149.98,331 149.98,341 164.98,341
  region: 331,145.3 341,145.3 341,130.3 331,130.3
  region: 331,-51.56 341,-51.56 341,-66.56 331,-66.56
  region: 243.72,-331 228.72,-331 228.72,-341 243.72,-341
  region: 46.87,-331 31.87,-331 31.87,-341 46.87,-341
  region: -149.98,-331 -164.98,-331 -164.98,-341 -149.98,-341
  region: -331,-130.3 -341,-130.3 -341,-145.3 -331,-145.3
  region: -331,66.56 -341,66.56 -341,51.56 -331,51.56
  lines w6: -280.5,-253.82 -280.5,-280.5 -253.82,-280.5 ; -280.5,253.82 -280.5,280.5 -253.82,280.5 ; 253.82,-280.5 280.5,-280.5 280.5,-253.82 ; 253.82,280.5 280.5,280.5 280.5,253.82
  text "*" at -358.5,236.06 h50
Mechanical 5:
  region: 340,-340 -340,-340 -340,340 340,340
Mechanical 7:
  lines w1: -428.25,-275.5 -236.22,-275.5 ; -428.25,275.5 -236.22,275.5 ; -315,236.22 -315,503.25 ; -275.5,-428.25 -275.5,-236.22 ; 235,413.25 285,413.25 ; 236.22,-315 503.25,-315 ; 236.22,315 503.25,315 ; 275.5,-428.25 275.5,-236.22 ; 285,236.22 285,428.25 ; 298.25,216.54 428.25,216.54 ; 298.25,236.22 428.25,236.22 ; 315,428.25 315,236.22 315,503.25 ; 365,413.25 315,413.25 ; 413.25,166.54 413.25,216.54 ; 413.25,286.22 413.25,236.22 ; -413.25,-275.5 -408.25,-265.5 -418.25,-265.5 -413.25,-275.5 ; -413.25,-275.5 -413.25,275.5 ; -413.25,275.5 -408.25,265.5 -418.25,265.5 -413.25,275.5 ; -315,488.25 -305,483.25 -305,493.25 -315,488.25 ; -315,488.25 315,488.25 ; -275.5,-413.25 -265.5,-418.25 -265.5,-408.25 -275.5,-413.25 ; -275.5,-413.25 275.5,-413.25 ; 275.5,-413.25 265.5,-418.25 265.5,-408.25 275.5,-413.25 ; 285,413.25 275,408.25 275,418.25 285,413.25 ; 315,413.25 325,408.25 325,418.25 315,413.25 ; 315,488.25 305,483.25 305,493.25 315,488.25 ; 413.25,216.54 418.25,206.54 408.25,206.54 413.25,216.54 ; 413.25,236.22 418.25,246.22 408.25,246.22 413.25,236.22 ; 488.25,-315 493.25,-305 483.25,-305 488.25,-315 ; 488.25,-315 488.25,315 ; 488.25,315 493.25,305 483.25,305 488.25,315
  text "0.63in/16.002mm" at 508.25,-12.5 h25
  text "0.551in/13.995mm" at -633.25,-12.5 h25
  text "0.551in/13.995mm" at -100,-458.25 h25
  text "0.63in/16.002mm" at -93.75,508.25 h25
  text "0.03in/0.762mm" at 212.5,433.25 h25
  text "0.02in/0.5mm" at 433.25,213.88 h25
  text "Alt 2 Padstyle: OX90Y60D30P" at -337.5,-863.25 h50
  text "Alt 1 Padstyle: OX60Y90D30P" at -337.5,-803.25 h50
  text "Default Vert Padstyle: RX9Y45p5D0T" at -425,-623.25 h50
  text "Default Horiz Padstyle: RX9Y45p5D0T" at -437.5,-563.25 h50
Mechanical 13:
  drawing of 405 lines, arcs and shapes, not listed
  text "*" at -273,221.06 h50
Mechanical 15:
  region: -244.72,-279.5 -279.5,-279.5 -279.5,-244.72 -325,-244.72 -325,244.72 -279.5,244.72 -279.5,279.5 -244.72,279.5 -244.72,325 244.72,325 244.72,279.5 279.5,279.5 279.5,244.72 325,244.72 325,-244.72 279.5,-244.72 279.5,-279.5 244.72,-279.5 244.72,-325 -244.72,-325
  lines w6: -325,-244.72 -325,244.72 -279.5,244.72 -279.5,279.5 -244.72,279.5 -244.72,325 244.72,325 244.72,279.5 279.5,279.5 279.5,244.72 325,244.72 325,-244.72 279.5,-244.72 279.5,-279.5 244.72,-279.5 244.72,-325 -244.72,-325 -244.72,-279.5 -279.5,-279.5 -279.5,-244.72 -325,-244.72
3D body: height 10, standoff 0, extent 0,0 10,10

## VQFP100_LAT-M - duplicate [mil]
pads (100):
  rect 61.5x11 smd paste+0 mask+0: 1(-306.25,236.22) 2(-306.25,216.54) 3(-306.25,196.85) 4(-306.25,177.17) 5(-306.25,157.48) 6(-306.25,137.8) 7(-306.25,118.11) 8(-306.25,98.43) 9(-306.25,78.74) 10(-306.25,59.06) 11(-306.25,39.37) 12(-306.25,19.69) 13(-306.25,0) 14(-306.25,-19.68) 15(-306.25,-39.37) 16(-306.25,-59.06) 17(-306.25,-78.74) 18(-306.25,-98.43) 19(-306.25,-118.11) 20(-306.25,-137.8) 21(-306.25,-157.48) 22(-306.25,-177.17) 23(-306.25,-196.85) 24(-306.25,-216.54) 25(-306.25,-236.22) 51(306.25,-236.22) 52(306.25,-216.54) 53(306.25,-196.85) 54(306.25,-177.17) 55(306.25,-157.48) 56(306.25,-137.8) 57(306.25,-118.11) 58(306.25,-98.43) 59(306.25,-78.74) 60(306.25,-59.06) 61(306.25,-39.37) 62(306.25,-19.68) 63(306.25,0) 64(306.25,19.68) 65(306.25,39.37) 66(306.25,59.06) 67(306.25,78.74) 68(306.25,98.43) 69(306.25,118.11) 70(306.25,137.8) 71(306.25,157.48) 72(306.25,177.17) 73(306.25,196.85) 74(306.25,216.54) 75(306.25,236.22)
  rect 11x61.5 smd paste+0 mask+0: 26(-236.22,-306.25) 27(-216.54,-306.25) 28(-196.85,-306.25) 29(-177.17,-306.25) 30(-157.48,-306.25) 31(-137.8,-306.25) 32(-118.11,-306.25) 33(-98.43,-306.25) 34(-78.74,-306.25) 35(-59.06,-306.25) 36(-39.37,-306.25) 37(-19.68,-306.25) 38(0,-306.25) 39(19.68,-306.25) 40(39.37,-306.25) 41(59.06,-306.25) 42(78.74,-306.25) 43(98.43,-306.25) 44(118.11,-306.25) 45(137.8,-306.25) 46(157.48,-306.25) 47(177.17,-306.25) 48(196.85,-306.25) 49(216.54,-306.25) 50(236.22,-306.25) 76(236.22,306.25) 77(216.54,306.25) 78(196.85,306.25) 79(177.17,306.25) 80(157.48,306.25) 81(137.8,306.25) 82(118.11,306.25) 83(98.43,306.25) 84(78.74,306.25) 85(59.06,306.25) 86(39.37,306.25) 87(19.68,306.25) 88(0,306.25) 89(-19.68,306.25) 90(-39.37,306.25) 91(-59.06,306.25) 92(-78.74,306.25) 93(-98.43,306.25) 94(-118.11,306.25) 95(-137.8,306.25) 96(-157.48,306.25) 97(-177.17,306.25) 98(-196.85,306.25) 99(-216.54,306.25) 100(-236.22,306.25)
Top Overlay:
  region: -347,66.56 -357,66.56 -357,51.56 -347,51.56
  region: -347,-130.3 -357,-130.3 -357,-145.3 -347,-145.3
  region: -149.98,-347 -164.98,-347 -164.98,-357 -149.98,-357
  region: 46.87,-347 31.87,-347 31.87,-357 46.87,-357
  region: 243.72,-347 228.72,-347 228.72,-357 243.72,-357
  region: 347,-51.56 357,-51.56 357,-66.56 347,-66.56
  region: 347,145.3 357,145.3 357,130.3 347,130.3
  region: 164.98,347 149.98,347 149.98,357 164.98,357
  region: -31.87,347 -46.87,347 -46.87,357 -31.87,357
  region: -228.72,347 -243.72,347 -243.72,357 -228.72,357
  lines w6: -280.5,-254.82 -280.5,-280.5 -254.82,-280.5 ; -280.5,254.82 -280.5,280.5 -254.82,280.5 ; 254.82,-280.5 280.5,-280.5 280.5,-254.82 ; 254.82,280.5 280.5,280.5 280.5,254.82
  text "*" at -374.5,236.06 h50
Mechanical 5:
  region: 372,-372 -372,-372 -372,372 372,372
Mechanical 7:
  lines w1: -436.25,-275.5 -236.22,-275.5 ; -436.25,275.5 -236.22,275.5 ; -315,236.22 -315,511.25 ; -275.5,-436.25 -275.5,-236.22 ; 235,421.25 285,421.25 ; 236.22,-315 511.25,-315 ; 236.22,315 511.25,315 ; 275.5,-436.25 275.5,-236.22 ; 285,236.22 285,436.25 ; 306.25,216.54 436.25,216.54 ; 306.25,236.22 436.25,236.22 ; 315,436.25 315,236.22 315,511.25 ; 365,421.25 315,421.25 ; 421.25,166.54 421.25,216.54 ; 421.25,286.22 421.25,236.22 ; -421.25,-275.5 -421.25,275.5 ; -421.25,-275.5 -426.25,-265.5 -416.25,-265.5 -421.25,-275.5 ; -421.25,275.5 -426.25,265.5 -416.25,265.5 -421.25,275.5 ; -315,496.25 315,496.25 ; -315,496.25 -305,501.25 -305,491.25 -315,496.25 ; -275.5,-421.25 275.5,-421.25 ; -275.5,-421.25 -265.5,-416.25 -265.5,-426.25 -275.5,-421.25 ; 275.5,-421.25 265.5,-416.25 265.5,-426.25 275.5,-421.25 ; 285,421.25 275,426.25 275,416.25 285,421.25 ; 315,421.25 325,426.25 325,416.25 315,421.25 ; 315,496.25 305,501.25 305,491.25 315,496.25 ; 421.25,216.54 416.25,206.54 426.25,206.54 421.25,216.54 ; 421.25,236.22 416.25,246.22 426.25,246.22 421.25,236.22 ; 496.25,-315 496.25,315 ; 496.25,-315 491.25,-305 501.25,-305 496.25,-315 ; 496.25,315 491.25,305 501.25,305 496.25,315
  text "Default Horiz Padstyle: RX11Y61p5D0T" at -450,-571.25 h50
  text "Default Vert Padstyle: RX11Y61p5D0T" at -437.5,-631.25 h50
  text "Alt 1 Padstyle: OX60Y90D30P" at -337.5,-811.25 h50
  text "Alt 2 Padstyle: OX90Y60D30P" at -337.5,-871.25 h50
  text "0.02in/0.5mm" at 441.25,213.88 h25
  text "0.03in/0.762mm" at 212.5,441.25 h25
  text "0.63in/16.002mm" at -93.75,516.25 h25
  text "0.551in/13.995mm" at -100,-466.25 h25
  text "0.551in/13.995mm" at -641.25,-12.5 h25
  text "0.63in/16.002mm" at 516.25,-12.5 h25
Mechanical 13:
  drawing of 405 lines, arcs and shapes, not listed
  text "*" at -273,221.06 h50
Mechanical 15:
  region: -261.72,-295.5 -295.5,-295.5 -295.5,-261.72 -357,-261.72 -357,261.72 -295.5,261.72 -295.5,295.5 -261.72,295.5 -261.72,357 261.72,357 261.72,295.5 295.5,295.5 295.5,261.72 357,261.72 357,-261.72 295.5,-261.72 295.5,-295.5 261.72,-295.5 261.72,-357 -261.72,-357
  lines w6: -357,-261.72 -295.5,-261.72 -295.5,-295.5 -261.72,-295.5 -261.72,-357 261.72,-357 261.72,-295.5 295.5,-295.5 295.5,-261.72 357,-261.72 357,261.72 295.5,261.72 295.5,295.5 261.72,295.5 261.72,357 -261.72,357 -261.72,295.5 -295.5,295.5 -295.5,261.72 -357,261.72 -357,-261.72
3D body: height 10, standoff 0, extent 0,0 10,10

## XT60 [mil]
pads (2):
  oval 250x300 hole 175: 0(0,0) 1(285,0)